# Altium footprint library myPcb.PcbLib: 145 footprints (part 2 of 10)
Each footprint in its own frame and in the unit in brackets; x right, y up, seen from the top. Pads: shape width x height; smd on the part's side, far side on the other; paste and mask are expansions set on the pad; w line width, h text height; cw(c..) or ccw(c..) is an arc to the next point about the centre after c.
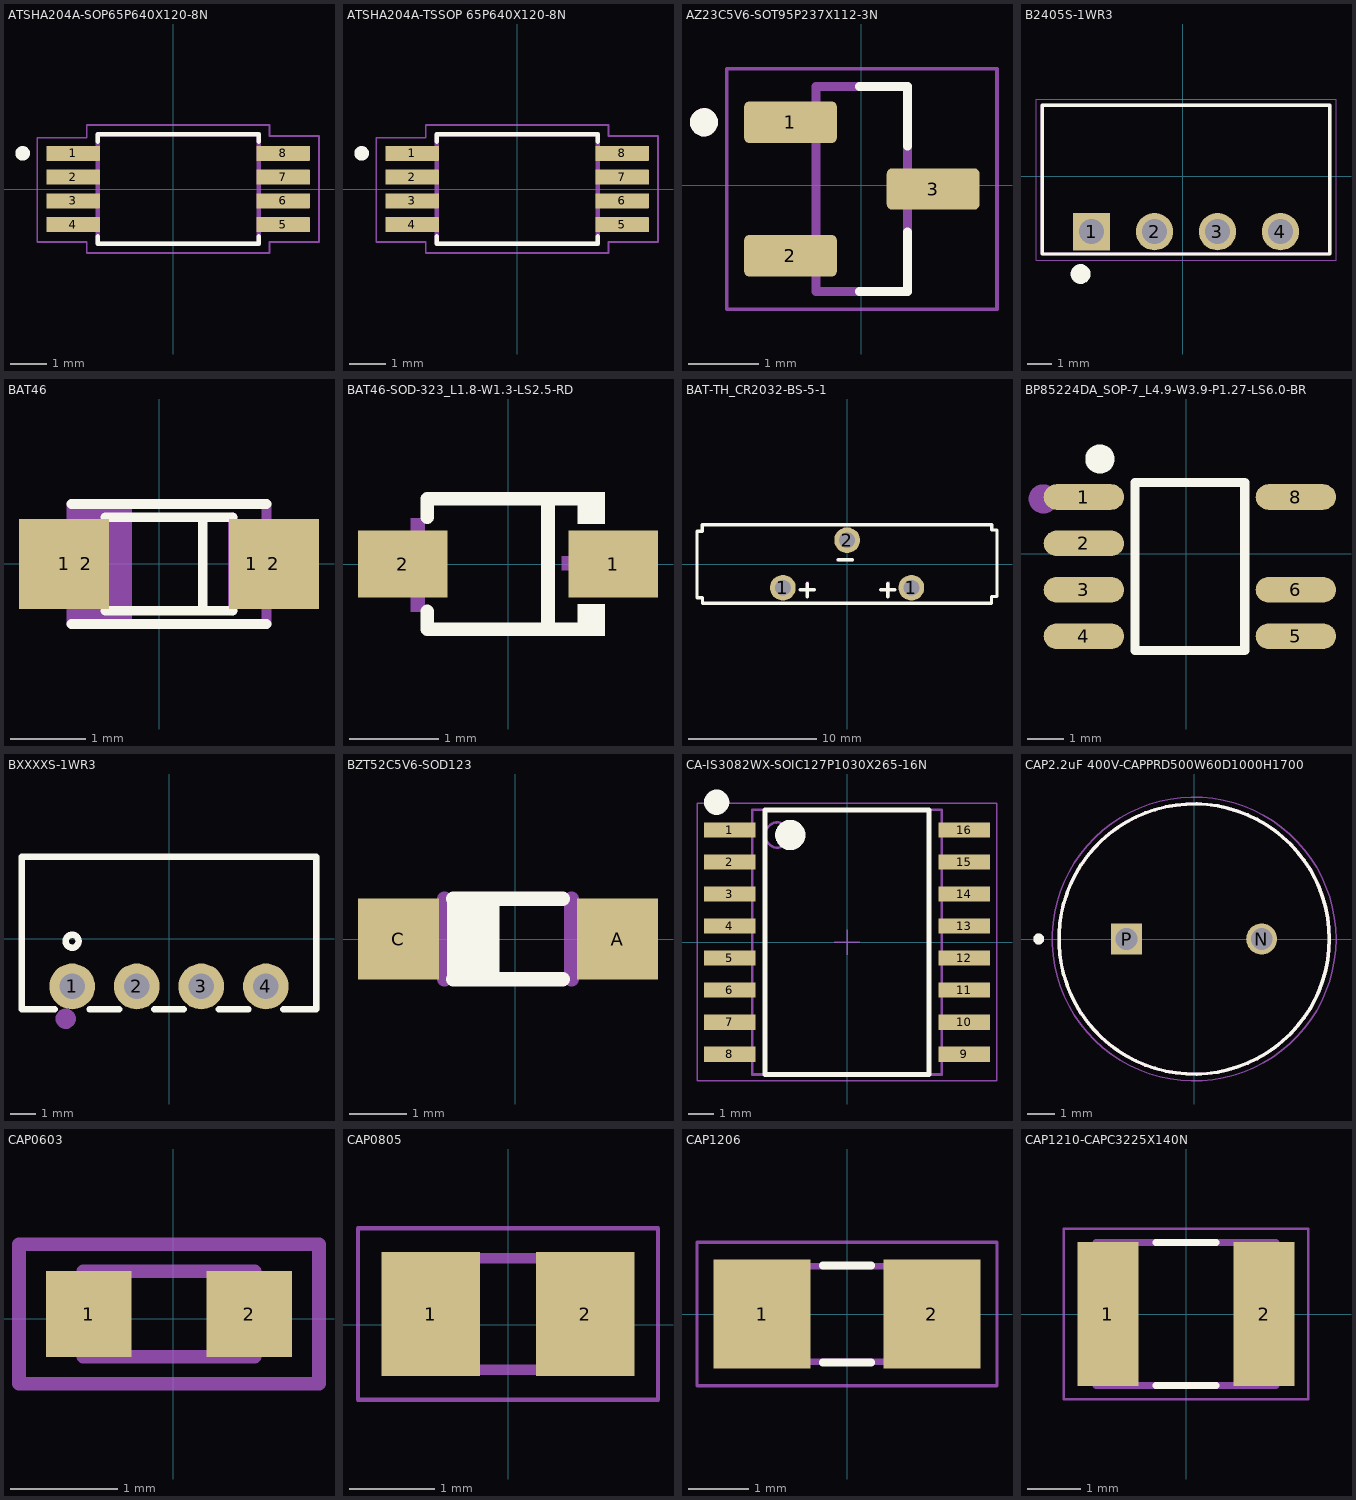
[diagram p1: the footprints below, top view; thin cyan lines are the x and y axes]

## ATSHA204A-SOP65P640X120-8N [mm] "ATSHA204A"
pads (8):
  rrect10% 1.47x0.41 smd: 1(-2.743,0.975) 2(-2.743,0.325) 3(-2.743,-0.325) 4(-2.743,-0.975) 5(2.997,-0.975) 6(2.997,-0.325) 7(2.997,0.325) 8(2.997,0.975)
Top Overlay:
  circle w0.2: c-4.123,0.975 r0.1
  lines w0.127: -2.073,-1.3 -2.073,-1.5 2.327,-1.5 2.327,-1.3 ; -2.073,1.3 -2.073,1.5 2.327,1.5 2.327,1.3
Mechanical 13:
  lines w0.127: -2.073,-1.5 2.327,-1.5 2.327,1.5 -2.073,1.5 -2.073,-1.5
Mechanical 15:
  lines w0.05: -3.723,-1.45 -2.373,-1.45 -2.373,-1.75 2.627,-1.75 2.627,-1.45 3.977,-1.45 3.977,1.45 2.627,1.45 2.627,1.75 -2.373,1.75 -2.373,1.4 -3.723,1.4 -3.723,-1.45

## ATSHA204A-TSSOP 65P640X120-8N [mm]
pads (8):
  rrect10% 1.47x0.41 smd: 1(-2.87,0.975) 2(-2.87,0.325) 3(-2.87,-0.325) 4(-2.87,-0.975) 5(2.87,-0.975) 6(2.87,-0.325) 7(2.87,0.325) 8(2.87,0.975)
Top Overlay:
  circle w0.2: c-4.25,0.975 r0.1
  lines w0.127: -2.2,-1.3 -2.2,-1.5 2.2,-1.5 2.2,-1.3 ; -2.2,1.3 -2.2,1.5 2.2,1.5 2.2,1.3
Mechanical 13:
  lines w0.127: -2.2,-1.5 2.2,-1.5 2.2,1.5 -2.2,1.5 -2.2,-1.5
Mechanical 15:
  lines w0.05: -3.85,-1.45 -2.5,-1.45 -2.5,-1.75 2.5,-1.75 2.5,-1.45 3.85,-1.45 3.85,1.45 2.5,1.45 2.5,1.75 -2.5,1.75 -2.5,1.4 -3.85,1.4 -3.85,-1.45

## AZ23C5V6-SOT95P237X112-3N [mm] "AZ23C5V6"
pads (3):
  rrect25% 1.32x0.59 smd: 1(-1.005,0.897) 2(-1.005,-1.003) 3(1.025,-0.053)
Top Overlay:
  circle w0.2: c-2.236,0.897 r0.1
  lines w0.127: -0.025,-1.513 0.66,-1.513 0.66,-0.668 ; -0.025,1.407 0.66,1.407 0.66,0.562
Mechanical 13:
  circle w0.2: c-2.236,0.897 r0.1
  lines w0.127: -0.64,-1.513 0.66,-1.513 0.66,1.407 -0.64,1.407 -0.64,-1.513
Mechanical 15:
  lines w0.05: -1.915,-1.763 1.935,-1.763 1.935,1.657 -1.915,1.657 -1.915,-1.763

## B2405S-1WR3 [mm] "DC-DC 24-5V"
pads (4):
  rect 1.508x1.508 hole 1: 1(-3.683,-2.227)
  round 1.508 hole 1: 2(-1.143,-2.227) 3(1.397,-2.227) 4(3.937,-2.227)
Top Overlay:
  circle w0.4: c-4.123,-3.937 r0.2
  lines w0.127: -5.673,-3.127 5.927,-3.127 5.927,2.873 -5.673,2.873 -5.673,-3.127
Mechanical 13:
  circle w0.4: c-3.623,-2.187 r0.2
  lines w0.127: -5.673,-3.127 5.927,-3.127 5.927,2.873 -5.673,2.873 -5.673,-3.127
Mechanical 15:
  lines w0.05: -5.923,-3.377 6.177,-3.377 6.177,3.123 -5.923,3.123 -5.923,-3.377

## BAT46 [mm]
pads (4):
  rect 1.2x1.2 smd paste-2: 1(-1.273,0) 2(1.527,0)
  rect 0.5x0.5 smd: 1(1.227,0) 2(-0.973,0)
Top Overlay:
  lines w0.127: -1.173,-0.8 1.427,-0.8 ; -1.173,0.8 1.427,0.8 ; -0.723,-0.625 0.577,-0.625 ; -0.723,0.625 0.577,0.625 ; 0.977,-0.625 0.577,-0.625 ; 0.977,0.625 0.577,0.625 ; 0.577,-0.625 0.577,0.625
Top Paste:
  region: -0.723,-0.551 -1.826,-0.551 -1.826,0.55 -0.723,0.55
  region: 2.077,-0.551 0.978,-0.551 0.978,0.55 2.077,0.55
Mechanical 13:
  region: -0.723,-0.15 -1.124,-0.15 -1.124,0.15 -0.723,0.15
  region: 1.377,-0.15 0.977,-0.15 0.977,0.15 1.377,0.15
  region: 1.877,-0.3 1.427,-0.3 1.427,0.3 1.877,0.3
  region: -1.173,-0.301 -1.626,-0.301 -1.626,0.3 -1.173,0.3
  region: -0.373,-0.8 -1.173,-0.8 -1.173,0.8 -0.373,0.8
  lines w0.127: -0.723,-0.625 -0.723,0.625 ; 0.977,-0.625 0.977,0.625 ; -1.173,-0.8 1.427,-0.8 1.427,0.8 -1.173,0.8 -1.173,-0.8

## BAT46-SOD-323_L1.8-W1.3-LS2.5-RD [mm] "BAT46"
pads (2):
  rect 1x0.75 smd paste+0 mask+0.051: 1(1.172,0) 2(-1.172,0)
Top Overlay:
  region: 0.775,0.802 0.775,0.45 1.08,0.45 1.08,0.802
  region: 0.775,-0.802 0.775,-0.45 1.08,-0.45 1.08,-0.802
  lines w0.152: -0.901,-0.53 -0.901,-0.726 0.851,-0.726 ; -0.901,0.52 -0.901,0.726 0.851,0.726 ; 0.447,-0.726 0.447,0.726
Mechanical 15:
  region: -1.083,-0.53 -1.083,0.51 -0.927,0.51 -0.927,-0.53
  region: -1.315,-0.09 -1.315,0.066 -0.691,0.066 -0.691,-0.09
  region: 1.225,-0.07 1.225,0.086 0.601,0.086 0.601,-0.07

## BAT-TH_CR2032-BS-5-1 [mm]
pads (3):
  round 2 hole 1.2 slot 1.205 at 0 deg paste+0 mask+0.051: 1(-4.989,-1.844) 1(5.011,-1.844) 2(0.011,1.856)
Top Overlay:
  lines w0.254: -11.673,-2.635 -11.673,2.546 ; -11.673,2.546 -11.267,2.546 -11.267,3.05 11.263,3.05 11.263,2.644 11.673,2.644 11.673,-2.534 ; -11.652,-2.635 -11.241,-2.635 -11.241,-3.041 ; -11.241,-3.05 11.238,-3.05 11.238,-2.534 11.644,-2.534 ; -3.643,-2.005 -2.525,-2.005 ; -3.084,-2.563 -3.084,-1.522 ; -0.697,0.332 0.421,0.332 ; 2.605,-2.005 3.723,-2.005 ; 3.164,-2.563 3.164,-1.522
Mechanical 15:
  region: -3.689,-1.894 -3.689,-2.094 -2.489,-2.094 -2.489,-1.894
  region: -3.189,-2.594 -2.989,-2.594 -2.989,-1.394 -3.189,-1.394
  region: 2.611,-1.894 2.611,-2.094 3.811,-2.094 3.811,-1.894
  region: 3.111,-2.594 3.311,-2.594 3.311,-1.394 3.111,-1.394
  region: -0.789,0.406 -0.789,0.306 -0.789,0.206 0.511,0.206 0.511,0.406

## BP85224DA_SOP-7_L4.9-W3.9-P1.27-LS6.0-BR [mm]
pads (7):
  oval 2.2x0.7 smd paste+0 mask+0.051: 1(-2.796,1.557) 2(-2.796,0.287) 3(-2.796,-0.983) 4(-2.796,-2.253) 5(3.007,-2.253) 6(3.007,-0.983) 8(3.007,1.557)
Top Overlay:
  lines w0.254: -1.396,-2.648 1.61,-2.648 1.61,1.952 0.604,1.952 -1.396,1.952 -1.396,-2.648
  lines w0.4: -2.158,2.597 cw(c-2.358,2.598) -2.158,2.599
Mechanical 15:
  circle w0.4: c-3.908,1.506 r0.2

## BXXXXS-1WR3 [mm] "B1205S-1WR3"
pads (4):
  round 1.8 hole 1 paste+0 mask+0.051: 1(-3.81,-1.879) 2(-1.27,-1.879) 3(1.27,-1.879) 4(3.81,-1.879)
Top Overlay:
  circle w0.254: c-3.81,-0.101 r0.254
  lines w0.254: -4.494,-2.779 -5.8,-2.779 -5.8,3.221 5.8,3.221 5.8,-2.779 4.494,-2.779 ; -3.126,-2.779 -1.954,-2.779 ; -0.586,-2.779 0.586,-2.779 ; 1.954,-2.779 3.126,-2.779
Mechanical 15:
  circle w0.4: c-4.064,-3.149 r0.2
  region: 4.5,-2.679 5.7,-2.679 5.7,3.121 -5.7,3.121 -5.7,-2.679 -4.5,-2.679 -4.5,-2.879 -5.8,-2.879 -5.9,-2.779 -5.9,3.221 -5.8,3.321 5.8,3.321 5.9,3.221 5.9,-2.779 5.8,-2.879 4.5,-2.879

## BZT52C5V6-SOD123 [mm] "BZT52C5V6"
pads (2):
  rect 1.4x1.4 smd: A(1.773,0) C(-2.027,0)
Top Overlay:
  region: -0.277,-0.65 -1.177,-0.65 -1.177,0.7 -0.277,0.7
  lines w0.254: -1.077,-0.7 0.823,-0.7 ; -1.077,0.7 0.823,0.7
Mechanical 13:
  region: 1.823,-0.45 1.073,-0.45 1.073,0.4 1.823,0.4
  region: -1.327,-0.45 -2.077,-0.45 -2.077,0.4 -1.327,0.4
  lines w0.254: -1.227,-0.7 -1.227,0.7 ; 0.973,-0.7 0.973,0.7
3D body "step_temp.STEP": height 0.8, standoff -0.73, extent -1.952,-0.775 1.698,0.775

## CA-IS3082WX-SOIC127P1030X265-16N [mm] "CA-IS3082WX"
pads (16):
  rect 2.05x0.6 smd: 1(-4.65,4.445) 2(-4.65,3.175) 3(-4.65,1.905) 4(-4.65,0.635) 5(-4.65,-0.635) 6(-4.65,-1.905) 7(-4.65,-3.175) 8(-4.65,-4.445) 9(4.65,-4.445) 10(4.65,-3.175) 11(4.65,-1.905) 12(4.65,-0.635) 13(4.65,0.635) 14(4.65,1.905) 15(4.65,3.175) 16(4.65,4.445)
Top Overlay:
  circle w0.6: c-5.17,5.55 r0.2
  circle w0.6: c-2.25,4.25 r0.3
  lines w0.2: -3.25,-5.25 -3.25,5.25 3.25,5.25 3.25,-5.25 -3.25,-5.25
Top Assembly:
  circle w0.1: c-2.75,4.25 r0.5
  lines w0.1: -3.75,-5.25 -3.75,5.25 3.75,5.25 3.75,-5.25 -3.75,-5.25
Mechanical 18:
  lines w0.05: -0.5,0 0.5,0 ; 0,-0.5 0,0.5 ; -5.95,-5.5 -5.95,5.5 5.95,5.5 5.95,-5.5 -5.95,-5.5
Mechanical 19:
  lines w0.001: -3.75,-5.25 -3.75,5.25 3.75,5.25 3.75,-5.25 -3.75,-5.25

## CAP2.2uF 400V-CAPPRD500W60D1000H1700 [mm] "CAP2.2uF 400V"
pads (2):
  round 1.15 hole 0.8: N(2.5,0)
  rect 1.15x1.15 hole 0.8: P(-2.5,0)
Top Overlay:
  circle w0.127: c0,0 r5
  circle w0.2: c-5.75,0 r0.1
Mechanical 13:
  circle w0.127: c0,0 r5
  circle w0.2: c-5.75,0 r0.1
Mechanical 15:
  circle w0.05: c0,0 r5.25

## CAP0603 [mm]
pads (2):
  rect 0.8x0.8 smd: 1(-0.791,0.046) 2(0.709,0.046)
Mechanical 13:
  lines w0.127: -0.841,-0.354 0.759,-0.354 0.759,0.446 -0.841,0.446 -0.841,-0.354
Mechanical 15:
  lines w0.127: -1.441,-0.604 1.359,-0.604 1.359,0.696 -1.441,0.696 -1.441,-0.604

## CAP0805 [mm]
pads (2):
  rect 1.15x1.45 smd: 1(-0.9,0.127) 2(0.9,0.127)
Mechanical 13:
  lines w0.127: -1,-0.523 1,-0.523 1,0.777 -1,0.777 -1,-0.523
Mechanical 15:
  lines w0.05: -1.75,-0.873 1.75,-0.873 1.75,1.127 -1.75,1.127 -1.75,-0.873
3D body "step_temp.STEP": height 0.94, standoff 0, extent -1.005,-0.498 1.005,0.752

## CAP1206 [mm]
pads (2):
  rect 1.6x1.8 smd: 1(-1.4,0) 2(1.4,0)
Top Overlay:
  lines w0.127: -0.4,-0.8 0.4,-0.8 ; -0.4,0.8 0.4,0.8
Mechanical 13:
  region: -0.952,-0.851 -1.702,-0.851 -1.702,0.849 -0.952,0.849
  region: 1.702,-0.849 0.952,-0.849 0.952,0.851 1.702,0.851
  lines w0.102: -0.965,-0.787 0.965,-0.787 ; -0.965,0.787 0.965,0.787
Mechanical 15:
  lines w0.051: -2.473,-1.183 2.473,-1.183 2.473,1.183 -2.473,1.183 -2.473,-1.183
3D body "step_temp.STEP": height 1.5, standoff 0, extent -1.6,-0.8 1.6,0.8

## CAP1210-CAPC3225X140N [mm] "CAP1210"
pads (2):
  rect 1.16x2.72 smd: 1(-1.475,0) 2(1.475,0)
Top Overlay:
  lines w0.127: -0.57,-1.35 0.57,-1.35 ; -0.57,1.35 0.57,1.35
Mechanical 13:
  lines w0.127: -1.7,-1.35 1.7,-1.35 1.7,1.35 -1.7,1.35 -1.7,-1.35
Mechanical 15:
  lines w0.05: -2.308,-1.608 2.308,-1.608 2.308,1.608 -2.308,1.608 -2.308,-1.608